# Altium footprint library Dr.Xiong_20160818.PcbLib: 266 footprints (part 10 of 17)
Each footprint in its own frame and in the unit in brackets; x right, y up, seen from the top. Pads: shape width x height; smd on the part's side, far side on the other; paste and mask are expansions set on the pad; w line width, h text height; cw(c..) or ccw(c..) is an arc to the next point about the centre after c.
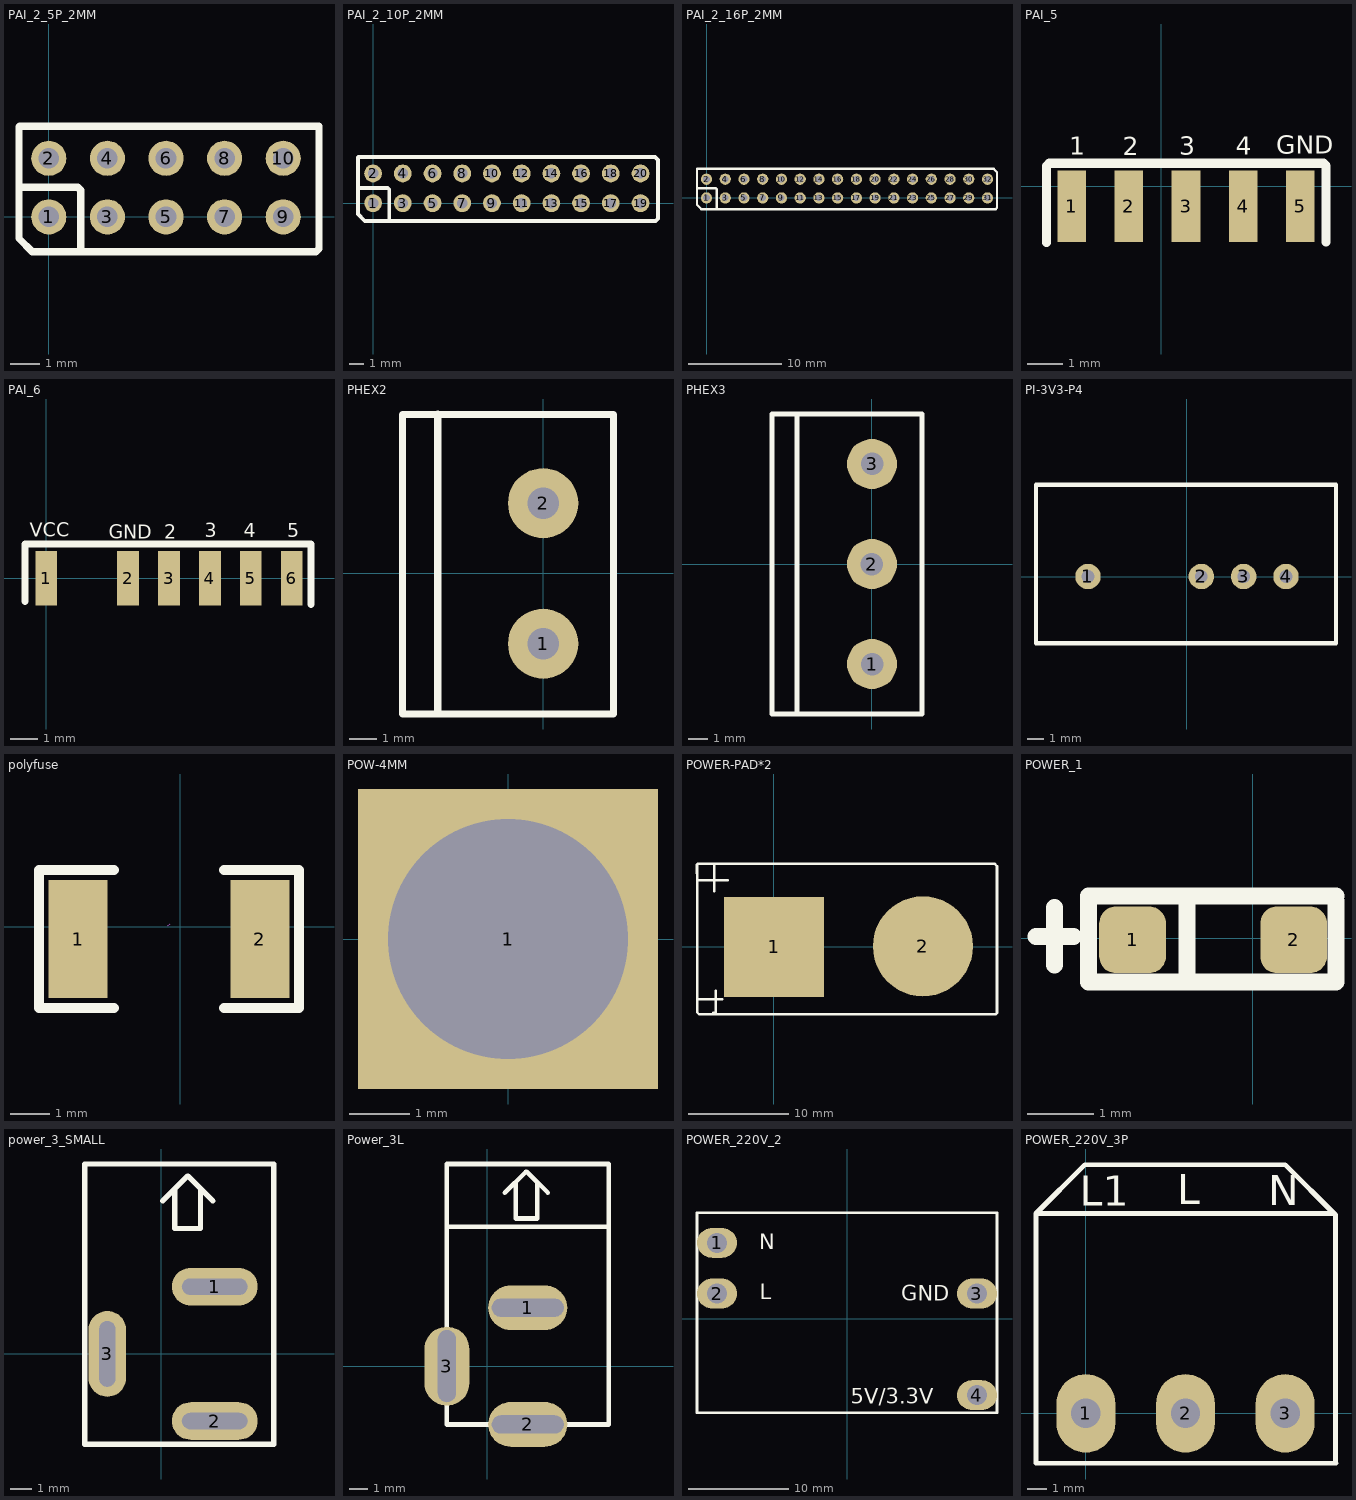
[diagram p9: the footprints below, top view; thin cyan lines are the x and y axes]

## PAI_2_5P_2MM [mm]
pads (10):
  round 1.2 hole 0.7: 1(0,0) 2(0,2) 3(2,0) 4(2,2) 5(4,0) 6(4,2) 7(6,0) 8(6,2) 9(8,0) 10(8,2)
Top Overlay:
  lines w0.254: -1.016,3.048 -1.016,-0.737 -0.559,-1.194 9.119,-1.194 9.22,-1.092 9.22,3.099 -0.991,3.099 -1.016,3.073 ; -0.94,1.016 0.991,1.016 1.092,0.914 1.092,-1.143

## PAI_2_10P_2MM [mm]
pads (20):
  round 1.2 hole 0.7: 1(0,0) 2(0,2) 3(2,0) 4(2,2) 5(4,0) 6(4,2) 7(6,0) 8(6,2) 9(8,0) 10(8,2) 11(10,0) 12(10,2) 13(12,0) 14(12,2) 15(14,0) 16(14,2) 17(16,0) 18(16,2) 19(18,0) 20(18,2)
Top Overlay:
  lines w0.254: -1.016,3.048 -1.016,-0.737 -0.559,-1.194 18.847,-1.194 19.025,-1.194 19.177,-1.041 19.177,2.896 18.974,3.099 18.898,3.099 ; -1.016,3.073 -0.991,3.099 18.923,3.099 ; -0.94,1.016 0.991,1.016 1.092,0.914 1.092,-1.143

## PAI_2_16P_2MM [mm]
pads (32):
  round 1.2 hole 0.7: 1(0,0) 2(0,2) 3(2,0) 4(2,2) 5(4,0) 6(4,2) 7(6,0) 8(6,2) 9(8,0) 10(8,2) 11(10,0) 12(10,2) 13(12,0) 14(12,2) 15(14,0) 16(14,2) 17(16,0) 18(16,2) 19(18,0) 20(18,2) 21(20,0) 22(20,2) 23(22,0) 24(22,2) 25(24,0) 26(24,2) 27(26,0) 28(26,2) 29(28,0) 30(28,2) 31(30,0) 32(30,2)
Top Overlay:
  lines w0.254: -1.016,3.048 -1.016,-0.737 -0.559,-1.194 30.861,-1.194 31.013,-1.041 31.013,2.743 30.658,3.099 -0.991,3.099 -1.016,3.073 ; -0.94,1.016 0.991,1.016 1.092,0.914 1.092,-1.143

## PAI_5 [mm]
pads (5):
  rect 0.8x2 smd: 1(-2.51,-0.57) 2(-0.91,-0.57) 3(0.69,-0.57) 4(2.29,-0.57) 5(3.89,-0.57)
Top Overlay:
  lines w0.254: -3.22,-1.58 -3.22,0.56 -3.14,0.64 -2.99,0.64 4.54,0.64 4.61,0.57 4.61,-1.56
  text "GND" at 3.22,0.91 h0.51
  text "4" at 2.08,0.88 h0.51
  text "3" at 0.5,0.88 h0.51
  text "2" at -1.08,0.86 h0.51
  text "1" at -2.58,0.88 h0.51

## PAI_6 [mm]
pads (6):
  rect 0.8x2 smd: 1(0,0) 2(3,0) 3(4.5,0) 4(6,0) 5(7.5,0) 6(9,0)
Top Overlay:
  lines w0.254: -0.787,-0.853 -0.787,1.245 8.765,1.245 9.703,1.245 9.703,-0.965
  text "2" at 4.318,1.448 h0.51
  text "3" at 5.817,1.499 h0.51
  text "4" at 7.239,1.499 h0.51
  text "5" at 8.839,1.499 h0.51
  text "VCC" at -0.61,1.524 h0.51
  text "GND" at 2.286,1.448 h0.51

## PHEX2 [mil]
pads (2):
  round 100 hole 45: 1(0,-100) 2(0,100)
Top Overlay:
  lines w10: -150,-200 -150,226.97 ; -200,-200 100,-200 100,225.98 -200,225.98 -200,-200

## PHEX3 [mil]
pads (3):
  round 100 hole 45: 1(0,-200) 2(0,0) 3(0,200)
Top Overlay:
  lines w10: -150,-300 -150,300 ; -200,-300 100,-300 100,300 -200,300 -200,-300

## PI-3V3-P4 [mil]
pads (4):
  round 60 hole 30: 1(-233.86,0) 2(33.86,0) 3(133.86,0) 4(233.86,0)
Top Overlay:
  lines w10: -356.69,-157.48 351.97,-157.48 351.97,216.54 -356.69,216.54 -356.69,-157.48

## polyfuse [mm]
pads (2):
  rect 1.5x3 smd: 1(-2.586,-0.307) 2(2.024,-0.307)
Top Overlay:
  lines w0.254: -1.681,-2.057 -3.581,-2.057 -3.581,1.443 -1.681,1.443 ; 1.119,-2.057 3.019,-2.057 3.019,1.443 1.119,1.443
Mechanical 15:
  lines w0.003: -0.307,0.03 -0.256,0.081

## POW-4MM [mm]
pads (1):
  rect 5x5 hole 4: 1(0,0)

## POWER-PAD*2 [mm]
pads (2):
  rect 10x10 smd: 1(0.025,-0.025)
  round 10 smd: 2(14.884,0.025)
Top Overlay:
  lines w0.254: -7.671,7.315 -7.671,8.179 -7.569,8.28 22.022,8.28 22.276,8.026 22.276,-6.604 22.123,-6.756 -7.442,-6.756 -7.645,-6.553 -7.645,7.544 ; -7.544,-5.232 -5.156,-5.232 ; -7.493,6.629 -4.623,6.629 ; -6.045,-6.579 -6.02,-6.604 ; -5.944,5.537 -5.944,8.128 ; -5.817,-6.553 -5.817,-4.394

## POWER_1 [mm]
pads (2):
  rrect50% 1x1 smd: 1(-1.803,-0.025) 2(0.61,-0.025)
Top Overlay:
  lines w0.254: -3.251,0.025 -2.692,0.025 ; -2.972,-0.406 -2.972,0.457 ; -2.464,-0.66 1.245,-0.66 ; -2.464,-0.61 -2.464,0.635 1.245,0.635 ; -0.991,-0.635 -0.991,0.584 ; 1.245,-0.635 1.245,0.559

## power_3_SMALL [mil]
pads (3):
  oval 160x70 hole 30 slot 122 at 0 deg: 1(100,125) 2(100,-125)
  oval 70x160 hole 30 slot 122 at 90 deg: 3(-100,0)
Top Overlay:
  lines w10: 2.95,284.45 49.21,330.71 50.2,330.71 96.46,284.45 ; 25.38,306.88 25.38,233.27 73.45,233.27 73.45,306.5 ; -141.73,-168.31 -141.73,353.35 209.65,353.35 209.65,-168.31 -141.73,-168.31

## Power_3L [mm]
pads (3):
  oval 4.4x2.5 hole 1 slot 4 at 0 deg: 1(2.25,3.25) 2(2.25,-3.25)
  oval 2.5x4.4 hole 1 slot 4 at 90 deg: 3(-2.25,0)
Top Overlay:
  lines w0.254: -2.25,-2.085 -2.25,-3.25 0.134,-3.25 ; -2.25,2.19 -2.25,11.25 6.75,11.25 6.75,-3.25 4.39,-3.25 ; -2.25,7.75 6.75,7.75 ; 0.975,9.64 2.15,10.815 2.2,10.815 3.375,9.64 ; 1.569,10.21 1.569,8.215 2.79,8.215 2.79,10.201

## POWER_220V_2 [mm]
pads (4):
  oval 4x3 hole 2: 1(-13,7.62) 2(-13,2.54) 3(13,2.54) 4(13,-7.62)
Top Overlay:
  lines w0.254: -15,-9.38 -15,10.62 15,10.62 15,-9.38 -15,-9.38
  text "5V/3.3V" at 0.356,-8.458 h1.52
  text "GND" at 5.436,1.829 h1.52
  text "L" at -8.738,1.956 h1.52
  text "N" at -8.788,6.96 h1.52

## POWER_220V_3P [mm]
pads (3):
  oval 3x4 hole 1.5: 1(0,0) 2(5.08,0) 3(10.16,0)
Top Overlay:
  lines w0.254: -2.515,10.185 12.649,10.185 12.548,10.185 ; -2.54,-2.54 -2.54,10.185 -0.051,12.675 10.16,12.675 12.725,10.109 12.725,-2.515 12.751,-2.54 -2.54,-2.54
  text "N" at 9.296,10.617 h1.52
  text "L" at 4.648,10.668 h1.52
  text "L1" at -0.305,10.592 h1.52